# Altium footprint library RES_TH.PcbLib: 94 footprints (part 1 of 6)
Each footprint in its own frame and in the unit in brackets; x right, y up, seen from the top. Pads: shape width x height; smd on the part's side, far side on the other; paste and mask are expansions set on the pad; w line width, h text height; cw(c..) or ccw(c..) is an arc to the next point about the centre after c.
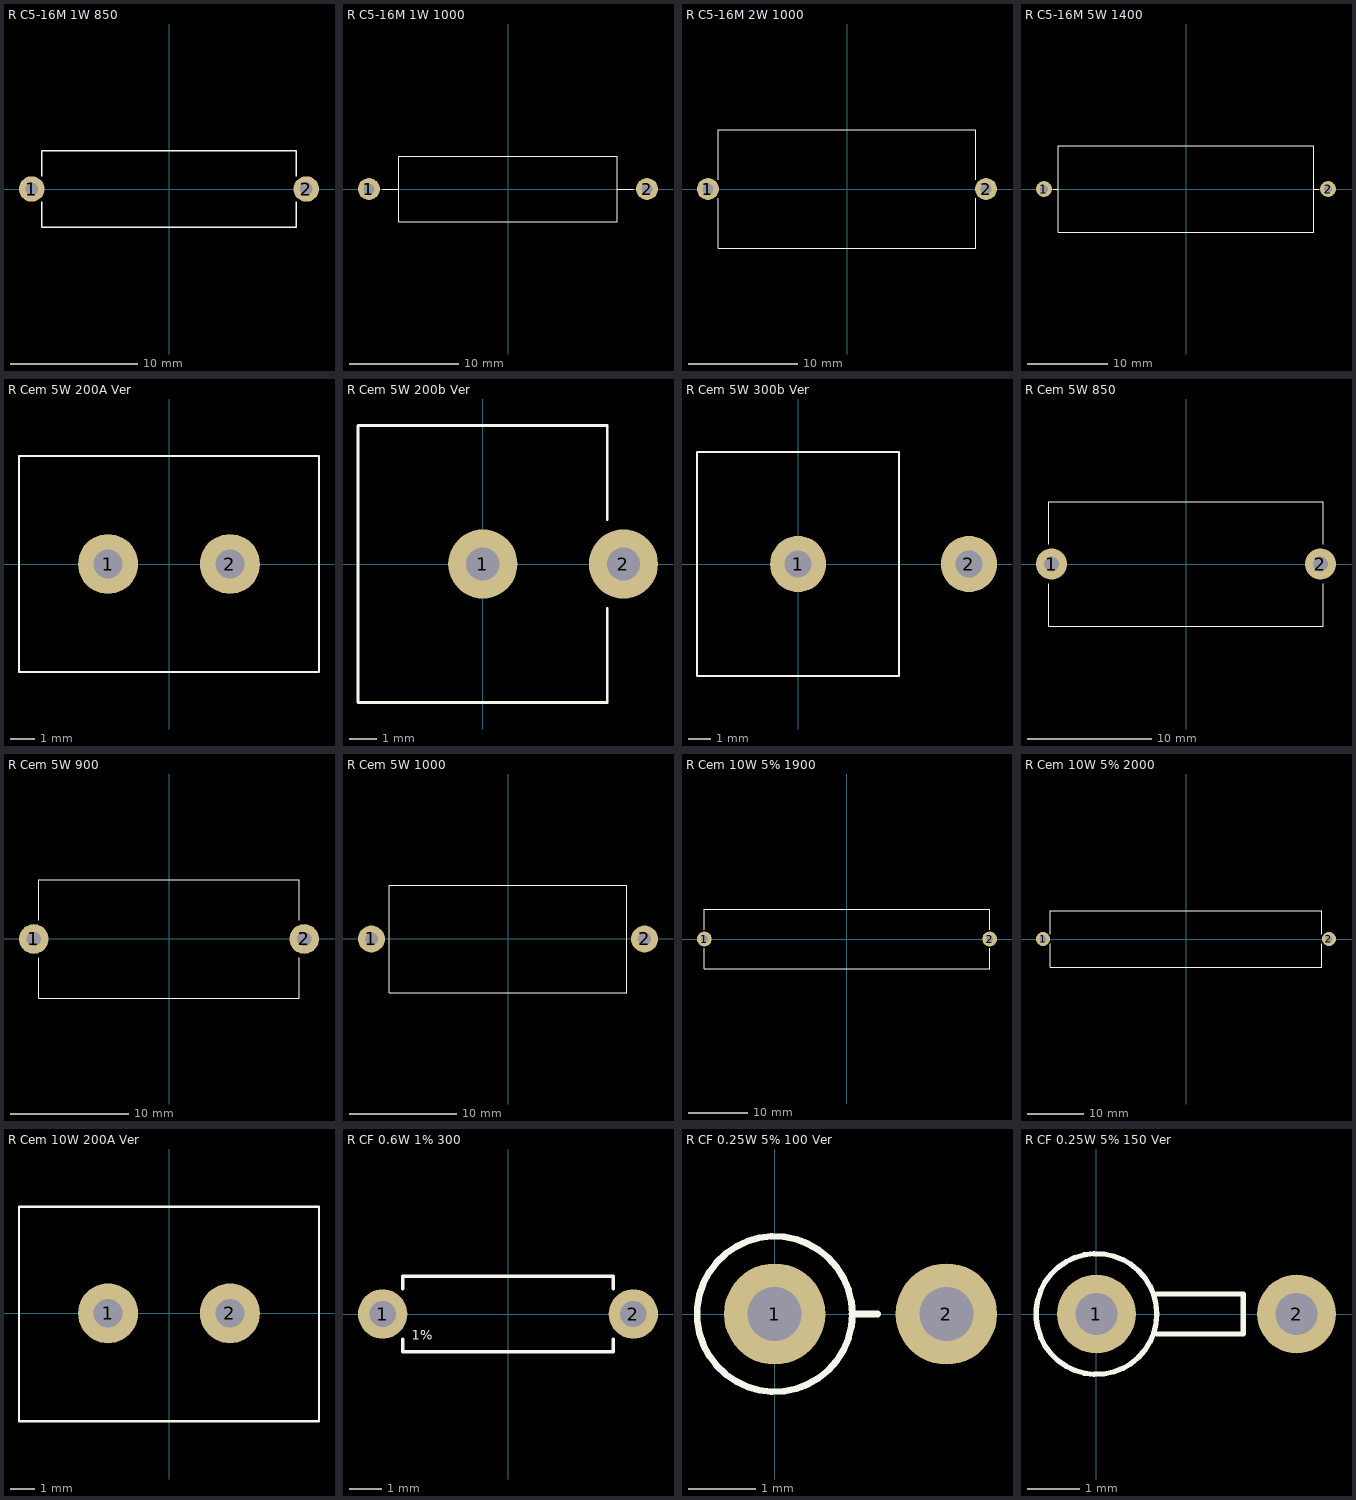
[diagram p0: the footprints below, top view; thin cyan lines are the x and y axes]

## R C5-16M 1W 850 [mm]
pads (2):
  round 2 hole 1: 1(-10.795,0) 2(10.795,0)
Top Overlay:
  lines w0.1: -10,-1.016 -10,-3 10,-3 10,-1.016 ; -10,1.016 -10,3 10,3 10,1.016
3D body "R1W C5-16M 850.SLDPRT": height 6, standoff -2.5, extent -11.291,-3 11.291,3

## R C5-16M 1W 1000 [mm]
pads (2):
  round 2 hole 1: 1(-12.7,0) 2(12.7,0)
Top Overlay:
  lines w0.1: -11.43,0 -10,0 ; 10,0 11.43,0 ; -10,-3 -10,3 10,3 10,-3 -10,-3
3D body "R1W C5-16M 1000.SLDPRT": height 6, standoff -2.5, extent -13.196,-3 13.196,3

## R C5-16M 2W 1000 [mm]
pads (2):
  round 2 hole 1: 1(-12.7,0) 2(12.7,0)
Top Overlay:
  lines w0.1: -12.7,0 -11.75,0 ; -11.75,-0.85 -11.75,-5.4 11.75,-5.4 11.75,-0.85 ; -11.75,0.85 -11.75,5.4 11.75,5.4 11.75,0.85
3D body "R2W C5-16M 1000.SLDPRT": height 10.8, standoff -2.5, extent -13.196,-5.4 13.196,5.4

## R C5-16M 5W 1400 [mm]
pads (2):
  round 2 hole 1: 1(-17.78,0) 2(17.78,0)
Top Overlay:
  lines w0.1: -16.6,0 -16,0 ; 16,0 16.6,0 ; -16,-5.4 -16,5.4 16,5.4 16,-5.4 -16,-5.4
3D body "R5W C5-16M 1400.SLDPRT": height 10.8, standoff -2.5, extent -18.276,-5.4 18.276,5.4

## R Cem 5W 200A Ver [mm]
pads (2):
  round 2.5 hole 1.2: 1(-2.54,0) 2(2.54,0)
Top Overlay:
  lines w0.1: -6.25,-4.5 -6.25,4.5 6.25,4.5 6.25,-4.5 -6.25,-4.5
3D body "R5W Cem 200A Ver.SLDPRT": height 25, standoff -5, extent -6.25,-4.5 6.25,4.5

## R Cem 5W 200b Ver [mm]
pads (2):
  round 2.5 hole 1.2: 1(0,0) 2(5.08,0)
Top Overlay:
  lines w0.1: 4.5,-1.6 4.5,-5 -4.51,-5 -4.51,5 4.5,5 4.5,1.6
3D body "R5W Cem 200B Ver.SLDPRT": height 24.94, standoff -2.5, extent -4.51,-5 5.48,5

## R Cem 5W 300b Ver [mm]
pads (2):
  round 2.5 hole 1.2: 1(0,0) 2(7.62,0)
Top Overlay:
  lines w0.1: -4.51,-5 -4.51,5 4.5,5 4.5,-5 -4.51,-5
3D body "R5W Cem 300B Ver.SLDPRT": height 26.2, standoff -2.5, extent -4.51,-5 8.02,5

## R Cem 5W 850 [mm]
height 10
pads (2):
  round 2.5 hole 1.2: 1(-10.795,0) 2(10.795,0)
Top Overlay:
  lines w0.1: -11.025,-1.6 -11.025,-5 11.025,-5 11.025,-1.6 ; -11.025,1.6 -11.025,5 11.025,5 11.025,1.6
3D body "R5W Cem 850.SLDPRT": height 9.01, standoff -2.5, extent -11.195,-5 11.195,5

## R Cem 5W 900 [mm]
height 10
pads (2):
  round 2.5 hole 1.2: 1(-11.43,0) 2(11.43,0)
Top Overlay:
  lines w0.1: -11.025,-1.6 -11.025,-5 11.025,-5 11.025,-1.6 ; -11.025,1.6 -11.025,5 11.025,5 11.025,1.6
3D body "R5W Cem 900.SLDPRT": height 9.01, standoff -2.5, extent -11.827,-5 11.827,5

## R Cem 5W 1000 [mm]
pads (2):
  round 2.5 hole 1.2: 1(-12.7,0) 2(12.7,0)
Top Overlay:
  lines w0.1: -11.025,-5 -11.025,5 11.025,5 11.025,-5 -11.025,-5
3D body "R5W Cem 1000.SLDPRT": height 9.01, standoff -2.5, extent -13.097,-5 13.097,5

## R Cem 10W 5% 1900 [mm]
height 10
pads (2):
  round 2.5 hole 1.2: 1(-24.13,0) 2(24.13,0)
Top Overlay:
  lines w0.1: -24.13,-1.524 -24.13,-5 24.13,-5 24.13,-1.524 ; -24.13,1.527 -24.13,5 24.13,5 24.13,1.527
3D body "R10W Cem 1900.SLDPRT": height 9.01, standoff -2.5, extent -24.53,-5 24.53,5

## R Cem 10W 5% 2000 [mm]
height 10
pads (2):
  round 2.5 hole 1.2: 1(-25.4,0) 2(25.4,0)
Top Overlay:
  lines w0.1: -24.13,-0.882 -24.13,-5 24.13,-5 24.13,-0.882 ; -24.13,0.886 -24.13,5 24.13,5 24.13,0.886
3D body "R10W Cem 2000.SLDPRT": height 9.01, standoff -2.5, extent -25.797,-5 25.797,5

## R Cem 10W 200A Ver [mm]
pads (2):
  round 2.5 hole 1.2: 1(-2.54,0) 2(2.54,0)
Top Overlay:
  lines w0.1: -6.25,-4.5 -6.25,4.445 6.25,4.445 6.25,-4.5 -6.25,-4.5
3D body "R10W Cem 200A Ver.SLDPRT": height 51, standoff -5, extent -6.25,-4.5 6.25,4.5

## R CF 0.6W 1% 300 [mm]
pads (2):
  round 1.5 hole 0.8: 1(-3.81,0) 2(3.81,0)
Top Overlay:
  lines w0.1: -3.2,-0.762 -3.2,-1.15 3.2,-1.15 3.2,-0.762 ; -3.2,0.762 -3.2,1.15 3.2,1.15 3.2,0.762
  text "1%" at -2.921,-0.889 h0.5
3D body "R0.6W 1% 300.SLDPRT": height 2.3, standoff -2.54, extent -4.108,-1.15 4.108,1.15

## R CF 0.25W 5% 100 Ver [mm]
pads (2):
  round 1.5 hole 0.8: 1(0,0) 2(2.54,0)
Top Overlay:
  circle w0.1: c0,0 r1.15
  lines w0.1: 1.143,0 1.524,0
3D body "R0.25W 5% 100 Ver.SLDPRT": height 8.06, standoff -2.54, extent -1.15,-1.15 2.838,1.15

## R CF 0.25W 5% 150 Ver [mm]
pads (2):
  round 1.5 hole 0.8: 1(0,0) 2(3.81,0)
Top Overlay:
  circle w0.1: c0,0 r1.15
  lines w0.1: 1.143,-0.381 2.794,-0.381 2.794,0.381 1.143,0.381
3D body "R0.25W 5% 150 Ver.SLDPRT": height 8.7, standoff -2.54, extent -1.15,-1.15 4.108,1.15